# Altium footprint library Footprints.PcbLib: 118 footprints (part 7 of 8)
Each footprint in its own frame and in the unit in brackets; x right, y up, seen from the top. Pads: shape width x height; smd on the part's side, far side on the other; paste and mask are expansions set on the pad; w line width, h text height; cw(c..) or ccw(c..) is an arc to the next point about the centre after c.
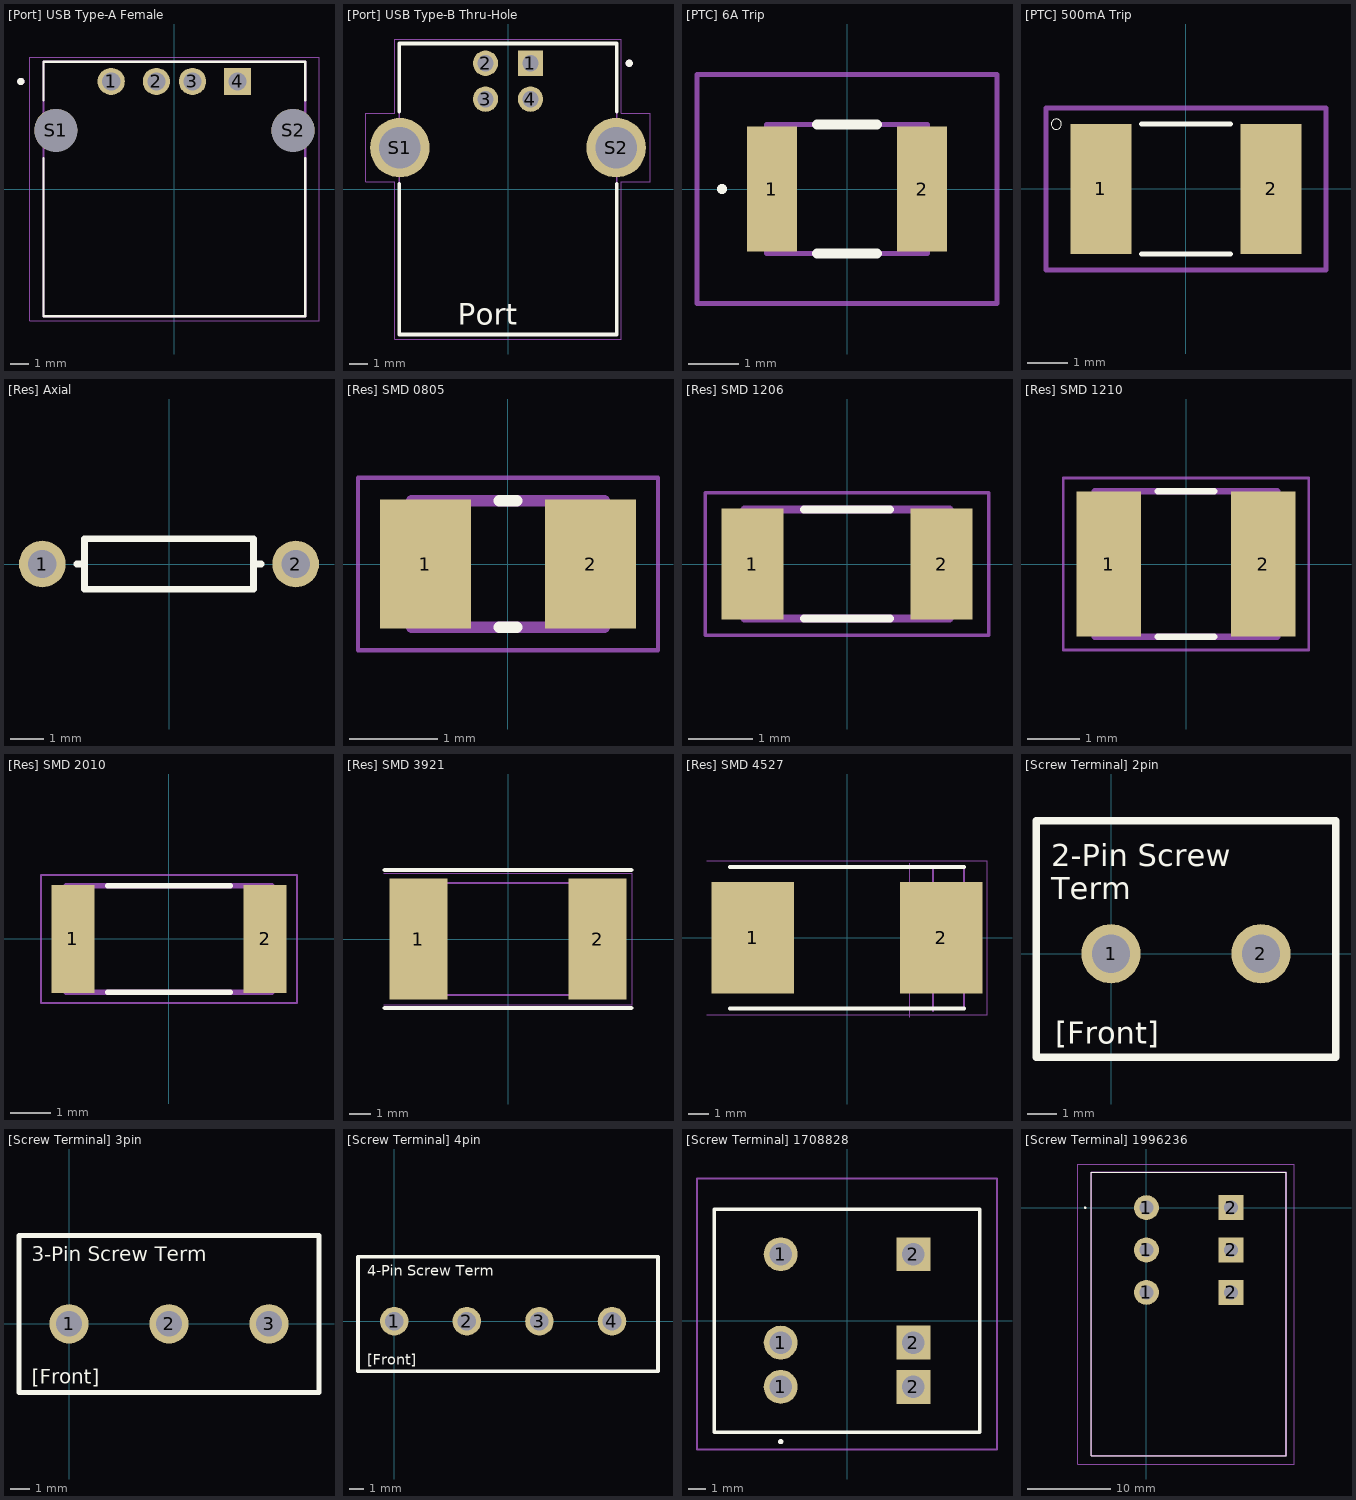
[diagram p6: the footprints below, top view; thin cyan lines are the x and y axes]

## [Port] USB Type-A Female [mm]
pads (6):
  round 1.508 hole 1: 1(-3.5,5.96) 2(-1,5.96) 3(1,5.96)
  rect 1.508x1.508 hole 1: 4(3.5,5.96)
  round 2.38 hole 2.38 unplated: S1(-6.57,3.25) S2(6.57,3.25)
Top Overlay:
  circle w0.2: c-8.51,5.96 r0.1
  lines w0.127: -7.25,1.7 -7.25,-7.05 7.25,-7.05 7.25,1.7 ; -7.25,4.9 -7.25,7.05 7.25,7.05 7.25,4.9
Physical Outline:
  circle w0.2: c-8.51,5.96 r0.1
  lines w0.127: -7.25,-7.05 -7.25,7.05 7.25,7.05 7.25,-7.05 -7.25,-7.05
Part Border:
  lines w0.05: -8.01,-7.3 8.01,-7.3 8.01,7.3 -8.01,7.3 -8.01,-7.3
3D body "USB Type A Female.STEP": height 7.6, standoff -3.2, extent -7.9,-7.05 7.9,7.05

## [Port] USB Type-B Thru-Hole [mm] "USB-B-S-F-B-TH"
pads (6):
  rect 1.408x1.408 hole 0.9: 1(1.25,7)
  round 1.408 hole 0.9: 2(-1.25,7) 3(-1.25,5) 4(1.25,5)
  round 3.316 hole 2.3: S1(-6.02,2.3) S2(6.02,2.3)
Top Overlay:
  circle w0.2: c6.75,7 r0.1
  lines w0.2: -6.05,0.29 -6.05,-8.1 6.05,-8.1 6.05,0.29 ; -6.05,4.31 -6.05,8.1 6.05,8.1 6.05,4.31
  text "Port" at -2.799,-7.55 h1.2
Physical Outline:
  circle w0.2: c6.75,7 r0.1
  lines w0.1: -6.05,-8.1 -6.05,8.1 6.05,8.1 6.05,-8.1 -6.05,-8.1
Part Border:
  lines w0.05: -7.93,0.39 -7.93,4.21 -6.3,4.21 -6.3,8.35 6.3,8.35 6.3,4.21 7.93,4.21 7.93,0.39 6.3,0.39 6.3,-8.35 -6.3,-8.35 -6.3,0.39 -7.93,0.39
3D body "USB Type B Female.stp": height 10.7, standoff -3.74, extent -7.25,-8.1 7.25,8.4

## [PTC] 6A Trip [mm]
pads (2):
  rect 1x2.5 smd: 1(-1.5,0) 2(1.5,0)
Top Overlay:
  lines w0.1: -2.55,0 ccw(c-2.5,0) -2.45,0 ccw(c-2.5,0) -2.55,0
  lines w0.2: -0.6,-1.288 0.6,-1.288 ; -0.6,1.288 0.6,1.288
Physical Outline:
  lines w0.1: -1.607,-1.288 1.607,-1.288 1.607,1.288 -1.607,1.288 -1.607,-1.288
Part Border:
  lines w0.1: -3,-2.288 3,-2.288 3,2.288 -3,2.288 -3,-2.288
3D body "MF-USML300_6-2.stp": height 1.3, standoff 0, extent -1.9,-1.288 1.9,1.288

## [PTC] 500mA Trip [mm] "Part #: MF-MSMF050-2"
pads (2):
  rect 1.5x3.2 smd: 1(-2.1,0) 2(2.1,0)
Top Overlay:
  circle w0: c-3.2,1.6 r0.127
  lines w0.127: -1.1,-1.6 1.1,-1.6 ; -1.1,1.6 1.1,1.6
Part Border:
  lines w0.127: -3.45,-2 3.45,-2 3.45,2 -3.45,2 -3.45,-2
3D body "SMD 500mA Resetable Fuse (MF-MSMF050-2).STEP": height 1.1, standoff 0, extent -2.275,-1.62 2.275,1.62

## [Res] Axial [mm]
pads (2):
  round 1.4 hole 0.85: 1(-3.81,0) 2(3.81,0)
Top Overlay:
  lines w0.2: -2.769,0 -2.54,0 ; 2.769,0 2.54,0 ; 2.54,0 2.54,0.762 -2.54,0.762 -2.54,-0.762 2.54,-0.762 2.54,0
3D body "Axial Resistor.step": height 3.2, standoff -1, extent -4.11,-1.198 4.11,1.198

## [Res] SMD 0805 [mm]
pads (2):
  rect 1.04x1.47 smd: 1(-0.94,0) 2(0.94,0)
Top Overlay:
  lines w0.127: -0.1,-0.72 0.1,-0.72 ; -0.1,0.72 0.1,0.72
Physical Outline:
  lines w0.127: -1.1,-0.72 1.1,-0.72 1.1,0.72 -1.1,0.72 -1.1,-0.72
Part Border:
  lines w0.05: -1.708,-0.983 1.708,-0.983 1.708,0.983 -1.708,0.983 -1.708,-0.983
3D body "SMD Resistor [0805].STEP": height 0.5, standoff 0, extent -1,-0.625 1,0.625

## [Res] SMD 1206 [mm]
pads (2):
  rect 0.97x1.73 smd: 1(-1.48,0) 2(1.48,0)
Top Overlay:
  lines w0.127: -0.67,-0.85 0.67,-0.85 ; -0.67,0.85 0.67,0.85
Physical Outline:
  lines w0.127: -1.6,-0.85 1.6,-0.85 1.6,0.85 -1.6,0.85 -1.6,-0.85
Part Border:
  lines w0.05: -2.215,-1.115 2.215,-1.115 2.215,1.115 -2.215,1.115 -2.215,-1.115
3D body "SMD Resistor [1206].STEP": height 0.65, standoff 0, extent -1.55,-0.8 1.55,0.8

## [Res] SMD 1210 [mm]
pads (2):
  rect 1.23x2.76 smd: 1(-1.466,0) 2(1.466,0)
Top Overlay:
  lines w0.127: -0.53,-1.38 0.53,-1.38 ; -0.53,1.38 0.53,1.38
Physical Outline:
  lines w0.127: -1.73,-1.38 -1.73,1.38 1.73,1.38 1.73,-1.38 -1.73,-1.38
Part Border:
  lines w0.05: -2.331,-1.631 -2.331,1.631 2.331,1.631 2.331,-1.631 -2.331,-1.631
3D body "SMD Resistor [1210].STEP": height 0.6, standoff 0, extent -1.6,-1.25 1.6,1.25

## [Res] SMD 2010 [mm]
pads (2):
  rect 1.07x2.67 smd: 1(-2.38,0) 2(2.38,0)
Top Overlay:
  lines w0.127: -1.52,-1.32 1.52,-1.32 ; -1.52,1.32 1.52,1.32
Physical Outline:
  lines w0.127: -2.55,-1.32 -2.55,1.32 2.55,1.32 2.55,-1.32 -2.55,-1.32
Part Border:
  lines w0.05: -3.165,-1.585 -3.165,1.585 3.165,1.585 3.165,-1.585 -3.165,-1.585
3D body "SMD Resistor [2010].STEP": height 0.65, standoff 0, extent -2.5,-1.25 2.5,1.25

## [Res] SMD 3921 [mm]
pads (2):
  rect 2.7x5.6 smd: 1(-4.15,0) 2(4.15,0)
Top Overlay:
  lines w0.2: -5.715,-3.2 5.715,-3.2 ; -5.715,3.2 5.715,3.2
Physical Outline:
  lines w0.1: -5,-2.6 -5,2.6 5,2.6 5,-2.6 -5,-2.6
Part Border:
  lines w0.05: -5.75,-3.05 5.75,-3.05 5.75,3.05 -5.75,3.05
3D body "WSL3921L2000FEA.stp": height 1.8, standoff 0, extent -5,-2.6 5,2.6

## [Res] SMD 4527 [mm]
pads (2):
  rect 4.05x5.5 smd: 1(-4.65,0) 2(4.65,0)
Top Overlay:
  lines w0.2: -5.78,-3.49 5.78,-3.49 ; -5.78,3.49 5.78,3.49
Physical Outline:
  lines w0.1: -5.78,-3.49 5.78,-3.49 5.78,3.49 -5.78,3.49 ; 4.253,-3.617 4.253,3.363
Part Border:
  lines w0.05: -6.925,-3.804 6.925,-3.804 6.925,3.804 -6.925,3.804 ; 3.108,-3.931 3.108,3.677
3D body "WSR5R0500FEA.stp": height 2.54, standoff 0, extent -5.78,-3.49 5.78,3.49

## [Screw Terminal] 2pin [mm]
pads (2):
  round 2 hole 1.3: 1(0,0) 2(5.08,0)
Top Overlay:
  lines w0.254: -2.54,-3.5 7.62,-3.5 7.62,4.5 -2.54,4.5 -2.54,-3.5
  text "2-Pin Screw / Term" at -2.032,1.845 h0.75
  text "[Front]" at -1.882,-3.042 h0.75
3D body "TB002-500-02BE.stp": height 9.99, standoff -4.36, extent -2.95,-3.5 7.55,4.1

## [Screw Terminal] 3pin [mm]
pads (3):
  round 2 hole 1.3: 1(0,0) 2(5.08,0) 3(10.16,0)
Top Overlay:
  lines w0.254: -2.54,-3.5 -2.54,4.5 12.7,4.5 12.7,-3.5 -2.54,-3.5
  text "3-Pin Screw Term" at -1.882,3.181 h0.75
  text "[Front]" at -1.882,-3.042 h0.75
3D body "Blue 3-pin Screw Terminal.step": height 10.5, standoff -1.5, extent -2.55,-4 12.6,4

## [Screw Terminal] 4pin [mm]
pads (4):
  round 2 hole 1.3: 1(0,0) 2(5.08,0) 3(10.16,0) 4(15.24,0)
Top Overlay:
  lines w0.254: -2.54,-3.5 -2.54,4.5 18.46,4.5 18.46,-3.5 -2.54,-3.5
  text "4-Pin Screw Term" at -1.882,3.181 h0.75
  text "[Front]" at -1.882,-3.042 h0.75
3D body "TB002-500-02BE.stp": height 9.99, standoff -4.36, extent 7.25,-3.5 17.75,4.1
3D body "TB002-500-02BE.stp": height 9.99, standoff -4.36, extent -2.95,-3.5 7.55,4.1

## [Screw Terminal] 1708828 [mm] "1708828"
pads (6):
  round 1.95 hole 1.3: 1(-3.81,-3.8) 1(-3.81,-1.26) 1(-3.81,3.82)
  rect 1.95x1.95 hole 1.3: 2(3.81,-3.8) 2(3.81,-1.26) 2(3.81,3.82)
Top Overlay:
  lines w0.2: -3.81,-7 ccw(c-3.81,-6.95) -3.81,-6.9 ; -3.81,-7 cw(c-3.81,-6.95) -3.81,-6.9 ; -3.81,-7 ccw(c-3.81,-6.95) -3.81,-6.9 ; -7.62,-6.4 7.62,-6.4 7.62,6.4 -7.62,6.4 -7.62,-6.4
Physical Outline:
  lines w0.1: -7.62,-6.4 7.62,-6.4 7.62,6.4 -7.62,6.4 -7.62,-6.4
Part Border:
  lines w0.1: -8.62,-7.4 8.62,-7.4 8.62,8.17 -8.62,8.17 -8.62,-7.4
3D body "1708828.stp": height 30.6, standoff -4.5, extent -7.62,-6.39 7.62,6.41

## [Screw Terminal] 1996236 [mm] "1996236"
pads (6):
  round 3 hole 1.7: 1(0,-10.16) 1(0,-5.08) 1(0,0)
  rect 3x3 hole 1.7: 2(10.16,-10.16) 2(10.16,-5.08) 2(10.16,0)
Top Overlay:
  circle w0.2: c-7.35,0 r0.05
  lines w0.1: -6.6,-29.76 16.76,-29.76 16.76,4.24 -6.6,4.24 -6.6,-29.76
Physical Outline:
  lines w0.2: -6.6,-29.76 16.76,-29.76 16.76,4.24 -6.6,4.24 -6.6,-29.76
Part Border:
  lines w0.05: -8.25,-30.76 17.76,-30.76 17.76,5.24 -8.25,5.24 -8.25,-30.76
3D body "1996236.stp": height 13.4, standoff -4.1, extent -6.489,-29.762 16.871,4.238